# Altium footprint library VESC_MotorController.PcbLib: 146 footprints (part 8 of 10)
Each footprint in its own frame and in the unit in brackets; x right, y up, seen from the top. Pads: shape width x height; smd on the part's side, far side on the other; paste and mask are expansions set on the pad; w line width, h text height; cw(c..) or ccw(c..) is an arc to the next point about the centre after c.
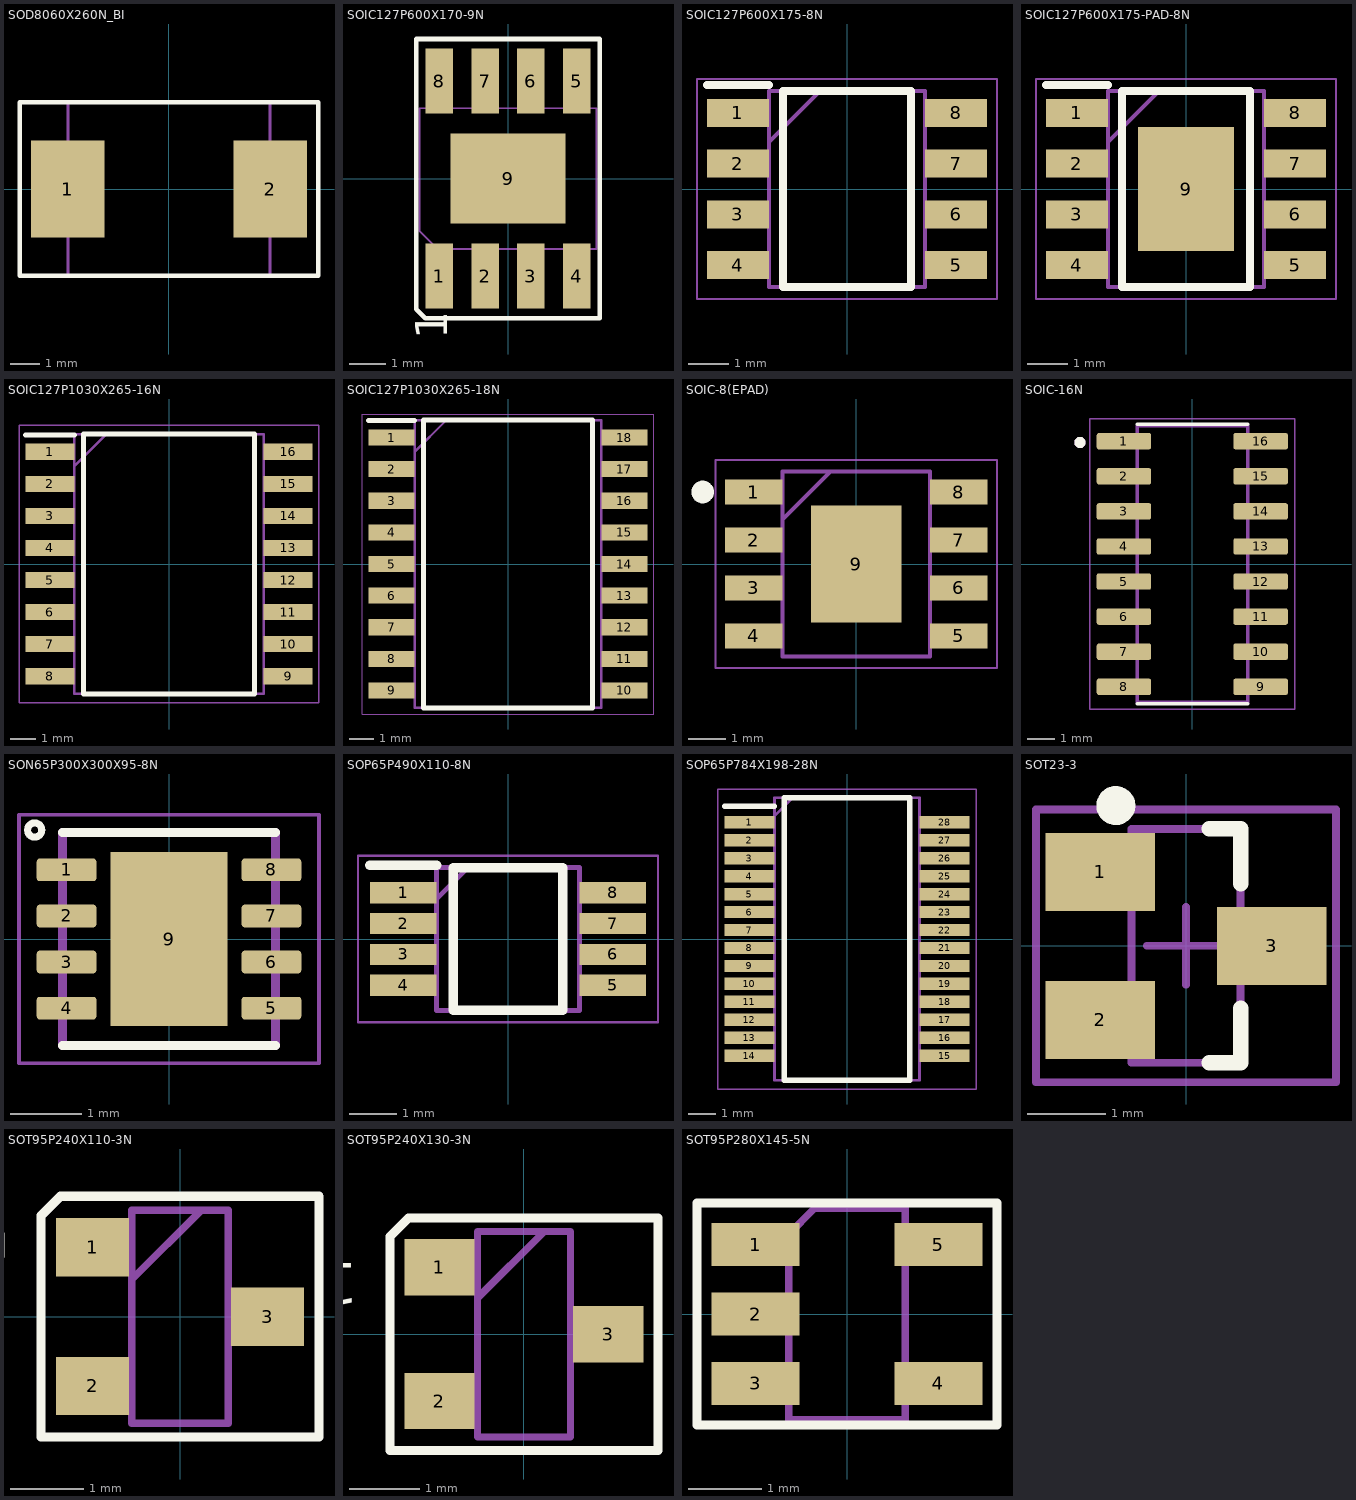
[diagram p7: the footprints below, top view; thin cyan lines are the x and y axes]

## SOD8060X260N_BI [mm] "SMLJ24CA-Q,TVS DIODE 24VWM 38.9VC SMC"
height 2.6
pads (2):
  rect 2.5x3.3 smd mask+0.051: 1(-3.45,0) 2(3.45,0)
Top Overlay:
  lines w0.152: -3.427,2.953 5.08,2.953 5.08,-2.953 -5.08,-2.953 -5.08,2.953 -3.162,2.953
Mechanical 13:
  lines w0.102: -3.162,2.953 -3.427,2.953 ; -3.427,2.953 -3.427,-2.953 3.427,-2.953 3.427,2.953 -3.427,2.953
  text ".Designator" at -0.786,-0.121 h1.02
3D body "User Library-DO-214AB SMC.step": height 2.3, standoff 0, extent -3.975,-2.95 3.975,2.95

## SOIC127P600X170-9N [mm] "LMR16030SDDAR"
height 1.7
pads (9):
  rect 0.762x1.8 smd mask+0.051: 1(-1.905,-2.7) 2(-0.635,-2.7) 3(0.635,-2.7) 4(1.905,-2.7) 5(1.905,2.7) 6(0.635,2.7) 7(-0.635,2.7) 8(-1.905,2.7)
  rect 3.2x2.5 smd mask+0.051: 9(0,0)
Top Overlay:
  lines w0.127: -2.54,-3.618 -2.54,3.867 2.54,3.867 2.54,-3.867 -2.291,-3.867 -2.54,-3.618
  text "1" at -1.397,-4.445 h1.52
Mechanical 13:
  lines w0.051: -2.45,-1.462 -2.45,1.95 2.45,1.95 2.45,-1.95 -1.962,-1.95 -2.45,-1.462
  text "8" at -2.209,1.665 h1.02
  text "5" at 1.524,1.8 h1.02
  text "4" at 1.6,-1.25 h1.02
  text "1" at -2.075,-1.303 h1.02
  text ".Designator" at 0.043,0.389 h1.02
3D body "SOIC127P600X170_HS-9N.step": height 1.7, standoff 0.01, extent -2.45,-2.993 2.45,2.993

## SOIC127P600X175-8N [mm]
pads (8):
  rect 1.55x0.7 smd: 1(-2.725,1.905) 2(-2.725,0.635) 3(-2.725,-0.635) 4(-2.725,-1.905) 5(2.725,-1.905) 6(2.725,-0.635) 7(2.725,0.635) 8(2.725,1.905)
Top Overlay:
  lines w0.2: -3.5,2.605 -1.95,2.605 ; -1.6,-2.45 1.6,-2.45 1.6,2.45 -1.6,2.45 -1.6,-2.45
Mechanical 15:
  lines w0.1: -1.95,1.18 -0.68,2.45 ; -1.95,-2.45 1.95,-2.45 1.95,2.45 -1.95,2.45 -1.95,-2.45
Mechanical 20:
  lines w0.05: -3.75,-2.75 3.75,-2.75 3.75,2.75 -3.75,2.75 -3.75,-2.75
3D body "TJA1051T_3_CM,118.stp": height 1.75, standoff 0, extent -3,-2.45 3,2.45

## SOIC127P600X175-PAD-8N [mm]
pads (9):
  rect 1.55x0.7 smd: 1(-2.725,1.905) 2(-2.725,0.635) 3(-2.725,-0.635) 4(-2.725,-1.905) 5(2.725,-1.905) 6(2.725,-0.635) 7(2.725,0.635) 8(2.725,1.905)
  rect 2.4x3.1 smd: 9(0,0)
Top Overlay:
  lines w0.2: -3.5,2.605 -1.95,2.605 ; -1.6,-2.45 1.6,-2.45 1.6,2.45 -1.6,2.45 -1.6,-2.45
Mechanical 15:
  lines w0.1: -1.95,1.18 -0.68,2.45 ; -1.95,-2.45 1.95,-2.45 1.95,2.45 -1.95,2.45 -1.95,-2.45
Mechanical 20:
  lines w0.05: -3.75,-2.75 3.75,-2.75 3.75,2.75 -3.75,2.75 -3.75,-2.75
3D body "TJA1051T_3_CM,118.stp": height 1.75, standoff 0, extent -3,-2.45 3,2.45

## SOIC127P1030X265-16N [mm]
pads (16):
  rect 1.95x0.65 smd: 1(-4.725,4.445) 2(-4.725,3.175) 3(-4.725,1.905) 4(-4.725,0.635) 5(-4.725,-0.635) 6(-4.725,-1.905) 7(-4.725,-3.175) 8(-4.725,-4.445) 9(4.725,-4.445) 10(4.725,-3.175) 11(4.725,-1.905) 12(4.725,-0.635) 13(4.725,0.635) 14(4.725,1.905) 15(4.725,3.175) 16(4.725,4.445)
Top Overlay:
  lines w0.2: -5.7,5.12 -3.75,5.12 ; -3.4,-5.15 3.4,-5.15 3.4,5.15 -3.4,5.15 -3.4,-5.15
Mechanical 15:
  lines w0.1: -3.75,3.88 -2.48,5.15 ; -3.75,-5.15 3.75,-5.15 3.75,5.15 -3.75,5.15 -3.75,-5.15
Mechanical 20:
  lines w0.05: -5.95,-5.5 5.95,-5.5 5.95,5.5 -5.95,5.5 -5.95,-5.5
3D body "UCC21520ADW.stp": height 2.59, standoff 0, extent -5.167,-5.15 5.167,5.15

## SOIC127P1030X265-18N [mm]
pads (18):
  rect 1.85x0.65 smd: 1(-4.675,5.08) 2(-4.675,3.81) 3(-4.675,2.54) 4(-4.675,1.27) 5(-4.675,0) 6(-4.675,-1.27) 7(-4.675,-2.54) 8(-4.675,-3.81) 9(-4.675,-5.08) 10(4.675,-5.08) 11(4.675,-3.81) 12(4.675,-2.54) 13(4.675,-1.27) 14(4.675,0) 15(4.675,1.27) 16(4.675,2.54) 17(4.675,3.81) 18(4.675,5.08)
Top Overlay:
  lines w0.2: -5.6,5.755 -3.75,5.755 ; -3.4,-5.775 3.4,-5.775 3.4,5.775 -3.4,5.775 -3.4,-5.775
Mechanical 15:
  lines w0.1: -3.75,4.505 -2.48,5.775 ; -3.75,-5.775 3.75,-5.775 3.75,5.775 -3.75,5.775 -3.75,-5.775
Mechanical 20:
  lines w0.05: -5.85,-6.025 5.85,-6.025 5.85,6.025 -5.85,6.025 -5.85,-6.025
3D body "PIC16F716-I_SO.stp": height 2.65, standoff 0, extent -5.15,-5.775 5.15,5.775

## SOIC-8(EPAD) [mm]
height 17.75
pads (9):
  rect 1.525x0.65 smd: 1(-2.712,1.905) 2(-2.712,0.635) 3(-2.712,-0.635) 4(-2.712,-1.905) 5(2.712,-1.905) 6(2.712,-0.635) 7(2.712,0.635) 8(2.712,1.905)
  rect 2.4x3.1 smd: 9(0,0)
Top Overlay:
  circle w0.3: c-4.064,1.905 r0.15
Mechanical 15:
  lines w0.1: -1.95,1.18 -0.68,2.45 ; -1.95,-2.45 1.95,-2.45 1.95,2.45 -1.95,2.45 -1.95,-2.45
Mechanical 16:
  lines w0.05: -3.725,-2.75 3.725,-2.75 3.725,2.75 -3.725,2.75 -3.725,-2.75
3D body "LM5164DDAR.stp": height 1.57, standoff 0, extent -3,-2.45 3,2.45

## SOIC-16N [mm]
pads (16):
  rrect25% 1.97x0.59 smd: 1(-2.475,4.445) 2(-2.475,3.175) 3(-2.475,1.905) 4(-2.475,0.635) 5(-2.475,-0.635) 6(-2.475,-1.905) 7(-2.475,-3.175) 8(-2.475,-4.445) 9(2.475,-4.445) 10(2.475,-3.175) 11(2.475,-1.905) 12(2.475,-0.635) 13(2.475,0.635) 14(2.475,1.905) 15(2.475,3.175) 16(2.475,4.445)
Top Overlay:
  circle w0.2: c-4.064,4.4 r0.1
  lines w0.127: -2,-5.06 2,-5.06 ; -2,5.06 2,5.06
Mechanical 13:
  circle w0.2: c-4.064,4.4 r0.1
  lines w0.127: -2,-5 -2,5 2,5 2,-5 -2,-5
Mechanical 15:
  lines w0.05: -3.71,-5.25 -3.71,5.25 3.71,5.25 3.71,-5.25 -3.71,-5.25
3D body "STGAP2DMTR.STEP": height 1.75, standoff 0, extent -3,-4.95 3,4.95

## SON65P300X300X80-9N [mm]
3D body "NTMTSC002N10MCTXG.stp": height 1.02, standoff 0, extent -4.15,-4.2 4.15,4.2

## SON65P300X300X95-8N [mm]
pads (9):
  rrect25% 0.84x0.32 smd: 1(-1.445,0.975) 2(-1.445,0.325) 3(-1.445,-0.325) 4(-1.445,-0.975) 5(1.445,-0.975) 6(1.445,-0.325) 7(1.445,0.325) 8(1.445,0.975)
  rect 1.65x2.45 smd paste-2: 9(0,0)
Top Overlay:
  circle w0.1: c-1.894,1.536 r0.1
  lines w0.127: -1.5,-1.5 1.5,-1.5 ; -1.5,1.5 1.5,1.5
Top Paste:
  region: 0.413,-0.633 -0.427,-0.633 -0.427,0.613 0.413,0.613
Mechanical 13:
  lines w0.127: -1.5,-1.5 -1.5,1.5 1.5,1.5 1.5,-1.5 -1.5,-1.5
Mechanical 15:
  lines w0.05: -2.115,-1.75 -2.115,1.75 2.115,1.75 2.115,-1.75 -2.115,-1.75
3D body "TJA1051TK_3,118.STEP": height 1, standoff 0, extent -1.5,-1.5 1.5,1.5

## SOP65P490X110-8N [mm]
pads (8):
  rect 1.4x0.45 smd: 1(-2.2,0.975) 2(-2.2,0.325) 3(-2.2,-0.325) 4(-2.2,-0.975) 5(2.2,-0.975) 6(2.2,-0.325) 7(2.2,0.325) 8(2.2,0.975)
Top Overlay:
  lines w0.2: -2.9,1.55 -1.5,1.55 ; -1.15,-1.5 -1.15,1.5 1.15,1.5 1.15,-1.5 -1.15,-1.5
Mechanical 15:
  lines w0.1: -1.5,0.85 -0.85,1.5 ; -1.5,-1.5 -1.5,1.5 1.5,1.5 1.5,-1.5 -1.5,-1.5
Mechanical 20:
  lines w0.05: -3.15,-1.75 -3.15,1.75 3.15,1.75 3.15,-1.75 -3.15,-1.75
3D body "MCP16311T-E_MS.stp": height 1.1, standoff 0, extent -2.45,-1.5 2.45,1.5

## SOP65P784X198-28N [mm]
pads (28):
  rect 1.8x0.45 smd: 1(-3.525,4.225) 2(-3.525,3.575) 3(-3.525,2.925) 4(-3.525,2.275) 5(-3.525,1.625) 6(-3.525,0.975) 7(-3.525,0.325) 8(-3.525,-0.325) 9(-3.525,-0.975) 10(-3.525,-1.625) 11(-3.525,-2.275) 12(-3.525,-2.925) 13(-3.525,-3.575) 14(-3.525,-4.225) 15(3.525,-4.225) 16(3.525,-3.575) 17(3.525,-2.925) 18(3.525,-2.275) 19(3.525,-1.625) 20(3.525,-0.975) 21(3.525,-0.325) 22(3.525,0.325) 23(3.525,0.975) 24(3.525,1.625) 25(3.525,2.275) 26(3.525,2.925) 27(3.525,3.575) 28(3.525,4.225)
Top Overlay:
  lines w0.2: -4.425,4.8 -2.625,4.8 ; -2.275,-5.1 -2.275,5.1 2.275,5.1 2.275,-5.1 -2.275,-5.1
Mechanical 15:
  lines w0.1: -2.622,4.45 -1.972,5.1 ; -2.622,-5.1 -2.622,5.1 2.622,5.1 2.622,-5.1 -2.622,-5.1
Mechanical 20:
  lines w0.05: -4.675,-5.42 -4.675,5.42 4.675,5.42 4.675,-5.42 -4.675,-5.42
3D body "PIC16F73-E_SS.STEP": height 2, standoff 0, extent -3.9,-5.1 3.9,5.1

## SOT23-3 [mm] "SOT23 semtech SM712"
height 1
pads (3):
  rect 1.4x1 smd: 1(-1.1,0.95) 2(-1.1,-0.95) 3(1.1,0)
Top Overlay:
  circle w0.25: c-0.9,1.8 r0.125
  lines w0.2: 0.3,-1.5 0.7,-1.5 0.7,-0.8 ; 0.3,1.5 0.7,1.5 0.7,0.8
Mechanical 13:
  lines w0.1: -0.7,-1.5 -0.7,1.5 0.7,1.5 0.7,-1.5 -0.7,-1.5
Mechanical 15:
  lines w0.1: -0.5,0 0.5,0 ; 0,-0.5 0,0.5 ; -1.925,-1.75 -1.925,1.75 1.925,1.75 1.925,-1.75 -1.925,-1.75
3D body: height 0.2, standoff 0, extent -1.422,0.711 -1.067,1.219
3D body: height 0.2, standoff 0, extent -1.473,-1.219 -1.067,-0.711
3D body: height 0.2, standoff 0, extent 1.067,-0.254 1.473,0.254
3D body: height 0.55, standoff 0, extent -1.067,0.711 -0.864,1.219
3D body: height 0.55, standoff 0, extent -1.067,-1.219 -0.864,-0.711
3D body: height 0.55, standoff 0, extent 0.864,-0.254 1.067,0.254
3D body: height 0.55, standoff 0.35, extent 0.66,-0.254 0.864,0.254
3D body: height 0.55, standoff 0.35, extent -0.864,-1.219 -0.66,-0.711
3D body: height 0.55, standoff 0.35, extent -0.864,0.711 -0.61,1.219
3D body: height 1.1, standoff 0.1, extent -0.7,-1.5 0.7,1.5

## SOT95P240X110-3N [mm] "BSS138"
height 1.1
pads (3):
  rect 1x0.8 smd mask+0.051: 1(-1.2,0.95) 2(-1.2,-0.95) 3(1.2,0)
Top Overlay:
  lines w0.127: -1.905,-1.651 -1.905,1.386 -1.64,1.651 1.905,1.651 1.905,-1.651 -1.905,-1.651
  text "1" at -2.208,0.708 h1.02
Mechanical 13:
  lines w0.102: -0.662,0.51 0.288,1.46 ; -0.662,-1.46 0.662,-1.46 0.662,1.46 -0.662,1.46 -0.662,-1.46
  text ".Designator" at 0.163,-0.715 h1.02
  text "1" at -0.94,0.899 h1.02
3D body "BAV99.stp": height 1.2, standoff 0, extent -1.2,-1.46 1.2,1.46

## SOT95P240X130-3N [mm] "BSS138"
height 1.1
pads (3):
  rect 1x0.8 smd mask+0.051: 1(-1.2,0.95) 2(-1.2,-0.95) 3(1.2,0)
Top Overlay:
  lines w0.127: -1.905,-1.651 1.905,-1.651 1.905,1.651 -1.64,1.651 -1.905,1.386 -1.905,-1.651
  text "1" at -2.358,1.208 h1.02
Mechanical 13:
  lines w0.102: -0.662,0.51 0.288,1.46 ; -0.662,-1.46 -0.662,1.46 0.662,1.46 0.662,-1.46 -0.662,-1.46
  text "1" at -0.954,1.459 h1.02
  text ".Designator" at -0.134,0.266 h1.02
3D body "BAV99.stp": height 1.2, standoff 0, extent -1.2,-1.46 1.2,1.46

## SOT95P280X145-5N [mm]
height 15
pads (5):
  rect 1.21x0.59 smd mask+0.051: 1(-1.255,0.95) 2(-1.255,0) 3(-1.255,-0.95) 4(1.255,-0.95) 5(1.255,0.95)
Top Overlay:
  lines w0.127: -2.057,-1.524 -2.057,1.524 2.057,1.524 2.057,-1.524 -2.057,-1.524
Mechanical 13:
  lines w0.102: -0.8,-1.45 0.8,-1.45 0.8,1.45 -0.445,1.45 -0.8,1.095 -0.8,-1.45
  text ".Designator" at 0.142,-0.61 h1.02
  text "1" at -1.517,0.655 h1.02
  text "3" at -1.533,-1.233 h1.02
  text "4" at 1.044,-1.245 h1.02
  text "5" at 1.255,0.667 h1.02
3D body "TLV71318PQDBVRQ1.STEP": height 1.45, standoff 0, extent -1.4,-1.45 1.4,1.45